# Altium footprint library con-molex.PCBLIB: 369 footprints (part 10 of 26) (continued)
## 52760-1079 [mm]
pads (104):
  round 0.9 hole 0.9: 1(-17.21,0)
  rect 0.35x2.5 smd: 1(-15.557,-2.35) 2(-15.557,2.35) 3(-14.922,-2.35) 4(-14.922,2.35) 5(-14.287,-2.35) 6(-14.287,2.35) 7(-13.652,-2.35) 8(-13.652,2.35) 9(-13.018,-2.35) 10(-13.018,2.35) 11(-12.383,-2.35) 12(-12.383,2.35) 13(-11.747,-2.35) 14(-11.747,2.35) 15(-11.112,-2.35) 16(-11.112,2.35) 17(-10.477,-2.35) 18(-10.477,2.35) 19(-9.842,-2.35) 20(-9.842,2.35) 21(-9.207,-2.35) 22(-9.207,2.35) 23(-8.572,-2.35) 24(-8.572,2.35) 25(-7.938,-2.35) 26(-7.938,2.35) 27(-7.302,-2.35) 28(-7.302,2.35) 29(-6.667,-2.35) 30(-6.667,2.35) 31(-6.032,-2.35) 32(-6.032,2.35) 33(-5.397,-2.35) 34(-5.397,2.35) 35(-4.763,-2.35) 36(-4.763,2.35) 37(-4.127,-2.35) 38(-4.127,2.35) 39(-3.492,-2.35) 40(-3.492,2.35) 41(-2.857,-2.35) 42(-2.857,2.35) 43(-2.222,-2.35) 44(-2.222,2.35) 45(-1.587,-2.35) 46(-1.587,2.35) 47(-0.953,-2.35) 48(-0.953,2.35) 49(-0.318,-2.35) 50(-0.318,2.35) 51(0.318,-2.35) 52(0.318,2.35) 53(0.953,-2.35) 54(0.953,2.35) 55(1.587,-2.35) 56(1.587,2.35) 57(2.222,-2.35) 58(2.222,2.35) 59(2.857,-2.35) 60(2.857,2.35) 61(3.492,-2.35) 62(3.492,2.35) 63(4.127,-2.35) 64(4.127,2.35) 65(4.763,-2.35) 66(4.763,2.35) 67(5.397,-2.35) 68(5.397,2.35) 69(6.032,-2.35) 70(6.032,2.35) 71(6.667,-2.35) 72(6.667,2.35) 73(7.302,-2.35) 74(7.302,2.35) 75(7.938,-2.35) 76(7.938,2.35) 77(8.572,-2.35) 78(8.572,2.35) 79(9.207,-2.35) 80(9.207,2.35) 81(9.842,-2.35) 82(9.842,2.35) 83(10.477,-2.35) 84(10.477,2.35) 85(11.112,-2.35) 86(11.112,2.35) 87(11.747,-2.35) 88(11.747,2.35) 89(12.383,-2.35) 90(12.383,2.35) 91(13.018,-2.35) 92(13.018,2.35) 93(13.652,-2.35) 94(13.652,2.35) 95(14.287,-2.35) 96(14.287,2.35) 97(14.922,-2.35) 98(14.922,2.35) 99(15.557,-2.35) 100(15.557,2.35)
  round 0.7 hole 0.7: 1(17.21,0)
  rect 2.5x2 smd: M1(-19.25,0) M2(19.25,0)
Top Overlay:
  lines w0.203: -19.125,-1.5 -19.725,-1.5 -19.725,-1.9 -18.525,-3.1 -17.725,-3.1 -17.725,-2.4 ; -19.125,1.5 -19.725,1.5 -19.725,3.1 -17.725,3.1 -17.725,2.4 ; -16.125,-2 -17.875,-2 -17.875,0 -17.125,0 -17.125,2 -16.125,2 ; -16.125,-1 cw(c-16.125,-0.75) -16.375,-0.75 -16.375,0.75 cw(c-16.125,0.75) -16.125,1 ; 16.125,-2 17.875,-2 17.875,0 17.125,0 17.125,2 16.125,2 ; 16.125,-1 ccw(c16.125,-0.75) 16.375,-0.75 16.375,0.75 ccw(c16.125,0.75) 16.125,1 ; 17.725,-2.4 17.725,-3.1 19.725,-3.1 19.725,-1.5 19.125,-1.5 ; 17.725,2.4 17.725,3.1 19.725,3.1 19.725,1.5 19.125,1.5
Top Solder:
  rectangle: -15.757,-3.625 -15.358,-1.075
  region: -15.358,3.625 -15.757,3.625 -15.757,1.075 -15.358,1.075
  rectangle: -15.122,-3.625 -14.723,-1.075
  region: -14.723,3.625 -15.122,3.625 -15.122,1.075 -14.723,1.075
  rectangle: -14.487,-3.625 -14.088,-1.075
  region: -14.088,3.625 -14.487,3.625 -14.487,1.075 -14.088,1.075
  rectangle: -13.852,-3.625 -13.453,-1.075
  region: -13.453,3.625 -13.852,3.625 -13.852,1.075 -13.453,1.075
  rectangle: -13.217,-3.625 -12.818,-1.075
  region: -12.818,3.625 -13.217,3.625 -13.217,1.075 -12.818,1.075
  rectangle: -12.582,-3.625 -12.183,-1.075
  region: -12.183,3.625 -12.582,3.625 -12.582,1.075 -12.183,1.075
  rectangle: -11.947,-3.625 -11.548,-1.075
  region: -11.548,3.625 -11.947,3.625 -11.947,1.075 -11.548,1.075
  rectangle: -11.312,-3.625 -10.913,-1.075
  region: -10.913,3.625 -11.312,3.625 -11.312,1.075 -10.913,1.075
  rectangle: -10.677,-3.625 -10.278,-1.075
  region: -10.278,3.625 -10.677,3.625 -10.677,1.075 -10.278,1.075
  rectangle: -10.042,-3.625 -9.643,-1.075
  region: -9.643,3.625 -10.042,3.625 -10.042,1.075 -9.643,1.075
  rectangle: -9.407,-3.625 -9.008,-1.075
  region: -9.008,3.625 -9.407,3.625 -9.407,1.075 -9.008,1.075
  rectangle: -8.772,-3.625 -8.373,-1.075
  region: -8.373,3.625 -8.772,3.625 -8.772,1.075 -8.373,1.075
  rectangle: -8.137,-3.625 -7.738,-1.075
  region: -7.738,3.625 -8.137,3.625 -8.137,1.075 -7.738,1.075
  rectangle: -7.502,-3.625 -7.103,-1.075
  region: -7.103,3.625 -7.502,3.625 -7.502,1.075 -7.103,1.075
  rectangle: -6.867,-3.625 -6.468,-1.075
  region: -6.468,3.625 -6.867,3.625 -6.867,1.075 -6.468,1.075
  rectangle: -6.232,-3.625 -5.833,-1.075
  region: -5.833,3.625 -6.232,3.625 -6.232,1.075 -5.833,1.075
  rectangle: -5.597,-3.625 -5.198,-1.075
  region: -5.198,3.625 -5.597,3.625 -5.597,1.075 -5.198,1.075
  rectangle: -4.962,-3.625 -4.563,-1.075
  region: -4.563,3.625 -4.962,3.625 -4.962,1.075 -4.563,1.075
  rectangle: -4.327,-3.625 -3.928,-1.075
  region: -3.928,3.625 -4.327,3.625 -4.327,1.075 -3.928,1.075
  rectangle: -3.692,-3.625 -3.293,-1.075
  region: -3.293,3.625 -3.692,3.625 -3.692,1.075 -3.293,1.075
  rectangle: -3.057,-3.625 -2.658,-1.075
  region: -2.658,3.625 -3.057,3.625 -3.057,1.075 -2.658,1.075
  rectangle: -2.422,-3.625 -2.023,-1.075
  region: -2.023,3.625 -2.422,3.625 -2.422,1.075 -2.023,1.075
  rectangle: -1.787,-3.625 -1.388,-1.075
  region: -1.388,3.625 -1.787,3.625 -1.787,1.075 -1.388,1.075
  rectangle: -1.152,-3.625 -0.753,-1.075
  region: -0.753,3.625 -1.152,3.625 -1.152,1.075 -0.753,1.075
  rectangle: -0.517,-3.625 -0.118,-1.075
  region: -0.118,3.625 -0.517,3.625 -0.517,1.075 -0.118,1.075
  rectangle: 0.118,-3.625 0.517,-1.075
  region: 0.517,3.625 0.118,3.625 0.118,1.075 0.517,1.075
  rectangle: 0.753,-3.625 1.152,-1.075
  region: 1.152,3.625 0.753,3.625 0.753,1.075 1.152,1.075
  rectangle: 1.388,-3.625 1.787,-1.075
  region: 1.787,3.625 1.388,3.625 1.388,1.075 1.787,1.075
  rectangle: 2.023,-3.625 2.422,-1.075
  region: 2.422,3.625 2.023,3.625 2.023,1.075 2.422,1.075
  rectangle: 2.658,-3.625 3.057,-1.075
  region: 3.057,3.625 2.658,3.625 2.658,1.075 3.057,1.075
  rectangle: 3.293,-3.625 3.692,-1.075
  region: 3.692,3.625 3.293,3.625 3.293,1.075 3.692,1.075
  rectangle: 3.928,-3.625 4.327,-1.075
  region: 4.327,3.625 3.928,3.625 3.928,1.075 4.327,1.075
  rectangle: 4.563,-3.625 4.962,-1.075
  region: 4.962,3.625 4.563,3.625 4.563,1.075 4.962,1.075
  rectangle: 5.198,-3.625 5.597,-1.075
  region: 5.597,3.625 5.198,3.625 5.198,1.075 5.597,1.075
  rectangle: 5.833,-3.625 6.232,-1.075
  region: 6.232,3.625 5.833,3.625 5.833,1.075 6.232,1.075
  rectangle: 6.468,-3.625 6.867,-1.075
  region: 6.867,3.625 6.468,3.625 6.468,1.075 6.867,1.075
  rectangle: 7.103,-3.625 7.502,-1.075
  region: 7.502,3.625 7.103,3.625 7.103,1.075 7.502,1.075
  rectangle: 7.738,-3.625 8.137,-1.075
  region: 8.137,3.625 7.738,3.625 7.738,1.075 8.137,1.075
  rectangle: 8.373,-3.625 8.772,-1.075
  region: 8.772,3.625 8.373,3.625 8.373,1.075 8.772,1.075
  rectangle: 9.008,-3.625 9.407,-1.075
  region: 9.407,3.625 9.008,3.625 9.008,1.075 9.407,1.075
  rectangle: 9.643,-3.625 10.042,-1.075
  region: 10.042,3.625 9.643,3.625 9.643,1.075 10.042,1.075
  rectangle: 10.278,-3.625 10.677,-1.075
  region: 10.677,3.625 10.278,3.625 10.278,1.075 10.677,1.075
  rectangle: 10.913,-3.625 11.312,-1.075
  region: 11.312,3.625 10.913,3.625 10.913,1.075 11.312,1.075
  rectangle: 11.548,-3.625 11.947,-1.075
  region: 11.947,3.625 11.548,3.625 11.548,1.075 11.947,1.075
  rectangle: 12.183,-3.625 12.582,-1.075
  region: 12.582,3.625 12.183,3.625 12.183,1.075 12.582,1.075
  rectangle: 12.818,-3.625 13.217,-1.075
  region: 13.217,3.625 12.818,3.625 12.818,1.075 13.217,1.075
  rectangle: 13.453,-3.625 13.852,-1.075
  region: 13.852,3.625 13.453,3.625 13.453,1.075 13.852,1.075
  rectangle: 14.088,-3.625 14.487,-1.075
  region: 14.487,3.625 14.088,3.625 14.088,1.075 14.487,1.075
  rectangle: 14.723,-3.625 15.122,-1.075
  region: 15.122,3.625 14.723,3.625 14.723,1.075 15.122,1.075
  rectangle: 15.358,-3.625 15.757,-1.075
  region: 15.757,3.625 15.358,3.625 15.358,1.075 15.757,1.075
Mechanical 16:
  rectangle: -15.708,-3.1 -15.407,-2.375
  region: -15.407,3.1 -15.708,3.1 -15.708,2.375 -15.407,2.375
  rectangle: -15.073,-3.1 -14.772,-2.375
  region: -14.772,3.1 -15.073,3.1 -15.073,2.375 -14.772,2.375
  rectangle: -14.438,-3.1 -14.137,-2.375
  region: -14.137,3.1 -14.438,3.1 -14.438,2.375 -14.137,2.375
  rectangle: -13.803,-3.1 -13.502,-2.375
  region: -13.502,3.1 -13.803,3.1 -13.803,2.375 -13.502,2.375
  rectangle: -13.168,-3.1 -12.867,-2.375
  region: -12.867,3.1 -13.168,3.1 -13.168,2.375 -12.867,2.375
  rectangle: -12.533,-3.1 -12.232,-2.375
  region: -12.232,3.1 -12.533,3.1 -12.533,2.375 -12.232,2.375
  rectangle: -11.898,-3.1 -11.597,-2.375
  region: -11.597,3.1 -11.898,3.1 -11.898,2.375 -11.597,2.375
  rectangle: -11.263,-3.1 -10.962,-2.375
  region: -10.962,3.1 -11.263,3.1 -11.263,2.375 -10.962,2.375
  rectangle: -10.628,-3.1 -10.327,-2.375
  region: -10.327,3.1 -10.628,3.1 -10.628,2.375 -10.327,2.375
  rectangle: -9.993,-3.1 -9.692,-2.375
  region: -9.692,3.1 -9.993,3.1 -9.993,2.375 -9.692,2.375
  rectangle: -9.358,-3.1 -9.057,-2.375
  region: -9.057,3.1 -9.358,3.1 -9.358,2.375 -9.057,2.375
  rectangle: -8.723,-3.1 -8.422,-2.375
  region: -8.422,3.1 -8.723,3.1 -8.723,2.375 -8.422,2.375
  rectangle: -8.088,-3.1 -7.787,-2.375
  region: -7.787,3.1 -8.088,3.1 -8.088,2.375 -7.787,2.375
  rectangle: -7.453,-3.1 -7.152,-2.375
  region: -7.152,3.1 -7.453,3.1 -7.453,2.375 -7.152,2.375
  rectangle: -6.818,-3.1 -6.517,-2.375
  region: -6.517,3.1 -6.818,3.1 -6.818,2.375 -6.517,2.375
  rectangle: -6.183,-3.1 -5.882,-2.375
  region: -5.882,3.1 -6.183,3.1 -6.183,2.375 -5.882,2.375
  rectangle: -5.548,-3.1 -5.247,-2.375
  region: -5.247,3.1 -5.548,3.1 -5.548,2.375 -5.247,2.375
  rectangle: -4.913,-3.1 -4.612,-2.375
  region: -4.612,3.1 -4.913,3.1 -4.913,2.375 -4.612,2.375
  rectangle: -4.278,-3.1 -3.977,-2.375
  region: -3.977,3.1 -4.278,3.1 -4.278,2.375 -3.977,2.375
  rectangle: -3.643,-3.1 -3.342,-2.375
  region: -3.342,3.1 -3.643,3.1 -3.643,2.375 -3.342,2.375
  rectangle: -3.008,-3.1 -2.707,-2.375
  region: -2.707,3.1 -3.008,3.1 -3.008,2.375 -2.707,2.375
  rectangle: -2.373,-3.1 -2.072,-2.375
  region: -2.072,3.1 -2.373,3.1 -2.373,2.375 -2.072,2.375
  rectangle: -1.738,-3.1 -1.437,-2.375
  region: -1.437,3.1 -1.738,3.1 -1.738,2.375 -1.437,2.375
  rectangle: -1.103,-3.1 -0.802,-2.375
  region: -0.802,3.1 -1.103,3.1 -1.103,2.375 -0.802,2.375
  rectangle: -0.468,-3.1 -0.167,-2.375
  region: -0.167,3.1 -0.468,3.1 -0.468,2.375 -0.167,2.375
  rectangle: 0.167,-3.1 0.468,-2.375
  region: 0.468,3.1 0.167,3.1 0.167,2.375 0.468,2.375
  rectangle: 0.802,-3.1 1.103,-2.375
  region: 1.103,3.1 0.802,3.1 0.802,2.375 1.103,2.375
  rectangle: 1.437,-3.1 1.738,-2.375
  region: 1.738,3.1 1.437,3.1 1.437,2.375 1.738,2.375
  rectangle: 2.072,-3.1 2.373,-2.375
  region: 2.373,3.1 2.072,3.1 2.072,2.375 2.373,2.375
  rectangle: 2.707,-3.1 3.008,-2.375
  region: 3.008,3.1 2.707,3.1 2.707,2.375 3.008,2.375
  rectangle: 3.342,-3.1 3.643,-2.375
  region: 3.643,3.1 3.342,3.1 3.342,2.375 3.643,2.375
  rectangle: 3.977,-3.1 4.278,-2.375
  region: 4.278,3.1 3.977,3.1 3.977,2.375 4.278,2.375
  rectangle: 4.612,-3.1 4.913,-2.375
  region: 4.913,3.1 4.612,3.1 4.612,2.375 4.913,2.375
  rectangle: 5.247,-3.1 5.548,-2.375
  region: 5.548,3.1 5.247,3.1 5.247,2.375 5.548,2.375
  rectangle: 5.882,-3.1 6.183,-2.375
  region: 6.183,3.1 5.882,3.1 5.882,2.375 6.183,2.375
  rectangle: 6.517,-3.1 6.818,-2.375
  region: 6.818,3.1 6.517,3.1 6.517,2.375 6.818,2.375
  rectangle: 7.152,-3.1 7.453,-2.375
  region: 7.453,3.1 7.152,3.1 7.152,2.375 7.453,2.375
  rectangle: 7.787,-3.1 8.088,-2.375
  region: 8.088,3.1 7.787,3.1 7.787,2.375 8.088,2.375
  rectangle: 8.422,-3.1 8.723,-2.375
  region: 8.723,3.1 8.422,3.1 8.422,2.375 8.723,2.375
  rectangle: 9.057,-3.1 9.358,-2.375
  region: 9.358,3.1 9.057,3.1 9.057,2.375 9.358,2.375
  rectangle: 9.692,-3.1 9.993,-2.375
  region: 9.993,3.1 9.692,3.1 9.692,2.375 9.993,2.375
  rectangle: 10.327,-3.1 10.628,-2.375
  region: 10.628,3.1 10.327,3.1 10.327,2.375 10.628,2.375
  rectangle: 10.962,-3.1 11.263,-2.375
  region: 11.263,3.1 10.962,3.1 10.962,2.375 11.263,2.375
  rectangle: 11.597,-3.1 11.898,-2.375
  region: 11.898,3.1 11.597,3.1 11.597,2.375 11.898,2.375
  rectangle: 12.232,-3.1 12.533,-2.375
  region: 12.533,3.1 12.232,3.1 12.232,2.375 12.533,2.375
  rectangle: 12.867,-3.1 13.168,-2.375
  region: 13.168,3.1 12.867,3.1 12.867,2.375 13.168,2.375
  rectangle: 13.502,-3.1 13.803,-2.375
  region: 13.803,3.1 13.502,3.1 13.502,2.375 13.803,2.375
  rectangle: 14.137,-3.1 14.438,-2.375
  region: 14.438,3.1 14.137,3.1 14.137,2.375 14.438,2.375
  rectangle: 14.772,-3.1 15.073,-2.375
  region: 15.073,3.1 14.772,3.1 14.772,2.375 15.073,2.375
  rectangle: 15.407,-3.1 15.708,-2.375
  region: 15.708,3.1 15.407,3.1 15.407,2.375 15.708,2.375
  lines w0.203: -19.125,-1.5 -19.125,1.5 ; -17.725,-2.4 17.725,-2.4 ; -17.725,2.4 17.725,2.4 ; -16.125,-2 16.125,-2 ; -16.125,-1 16.125,-1 ; -16.125,1 16.125,1 ; -16.125,2 16.125,2 ; 19.125,-1.5 19.125,1.5

## 52760-1279 [mm]
pads (124):
  round 0.9 hole 0.9: 1(-20.385,0)
  rect 0.35x2.5 smd: 1(-18.732,-2.35) 2(-18.732,2.35) 3(-18.098,-2.35) 4(-18.098,2.35) 5(-17.462,-2.35) 6(-17.462,2.35) 7(-16.828,-2.35) 8(-16.828,2.35) 9(-16.192,-2.35) 10(-16.192,2.35) 11(-15.557,-2.35) 12(-15.557,2.35) 13(-14.922,-2.35) 14(-14.922,2.35) 15(-14.287,-2.35) 16(-14.287,2.35) 17(-13.652,-2.35) 18(-13.652,2.35) 19(-13.018,-2.35) 20(-13.018,2.35) 21(-12.383,-2.35) 22(-12.383,2.35) 23(-11.747,-2.35) 24(-11.747,2.35) 25(-11.112,-2.35) 26(-11.112,2.35) 27(-10.477,-2.35) 28(-10.477,2.35) 29(-9.842,-2.35) 30(-9.842,2.35) 31(-9.207,-2.35) 32(-9.207,2.35) 33(-8.572,-2.35) 34(-8.572,2.35) 35(-7.938,-2.35) 36(-7.938,2.35) 37(-7.302,-2.35) 38(-7.302,2.35) 39(-6.667,-2.35) 40(-6.667,2.35) 41(-6.032,-2.35) 42(-6.032,2.35) 43(-5.397,-2.35) 44(-5.397,2.35) 45(-4.763,-2.35) 46(-4.763,2.35) 47(-4.127,-2.35) 48(-4.127,2.35) 49(-3.492,-2.35) 50(-3.492,2.35) 51(-2.857,-2.35) 52(-2.857,2.35) 53(-2.222,-2.35) 54(-2.222,2.35) 55(-1.587,-2.35) 56(-1.587,2.35) 57(-0.953,-2.35) 58(-0.953,2.35) 59(-0.318,-2.35) 60(-0.318,2.35) 61(0.318,-2.35) 62(0.318,2.35) 63(0.953,-2.35) 64(0.953,2.35) 65(1.587,-2.35) 66(1.587,2.35) 67(2.222,-2.35) 68(2.222,2.35) 69(2.857,-2.35) 70(2.857,2.35) 71(3.492,-2.35) 72(3.492,2.35) 73(4.127,-2.35) 74(4.127,2.35) 75(4.763,-2.35) 76(4.763,2.35) 77(5.397,-2.35) 78(5.397,2.35) 79(6.032,-2.35) 80(6.032,2.35) 81(6.667,-2.35) 82(6.667,2.35) 83(7.302,-2.35) 84(7.302,2.35) 85(7.938,-2.35) 86(7.938,2.35) 87(8.572,-2.35) 88(8.572,2.35) 89(9.207,-2.35) 90(9.207,2.35) 91(9.842,-2.35) 92(9.842,2.35) 93(10.477,-2.35) 94(10.477,2.35) 95(11.112,-2.35) 96(11.112,2.35) 97(11.747,-2.35) 98(11.747,2.35) 99(12.383,-2.35) 100(12.383,2.35) 101(13.018,-2.35) 102(13.018,2.35) 103(13.652,-2.35) 104(13.652,2.35) 105(14.287,-2.35) 106(14.287,2.35) 107(14.922,-2.35) 108(14.922,2.35) 109(15.557,-2.35) 110(15.557,2.35) 111(16.192,-2.35) 112(16.192,2.35) 113(16.828,-2.35) 114(16.828,2.35) 115(17.462,-2.35) 116(17.462,2.35) 117(18.098,-2.35) 118(18.098,2.35) 119(18.732,-2.35) 120(18.732,2.35)
  round 0.7 hole 0.7: 1(20.385,0)
  rect 2.5x2 smd: M1(-22.425,0) M2(22.425,0)
Top Overlay:
  lines w0.203: -22.3,-1.5 -22.9,-1.5 -22.9,-1.9 -21.7,-3.1 -20.9,-3.1 -20.9,-2.4 ; -22.3,1.5 -22.9,1.5 -22.9,3.1 -20.9,3.1 -20.9,2.4 ; -19.3,-2 -21.05,-2 -21.05,0 -20.3,0 -20.3,2 -19.3,2 ; -19.3,-1 cw(c-19.3,-0.75) -19.55,-0.75 -19.55,0.75 cw(c-19.3,0.75) -19.3,1 ; 19.3,-2 21.05,-2 21.05,0 20.3,0 20.3,2 19.3,2 ; 19.3,-1 ccw(c19.3,-0.75) 19.55,-0.75 19.55,0.75 ccw(c19.3,0.75) 19.3,1 ; 20.9,-2.4 20.9,-3.1 22.9,-3.1 22.9,-1.5 22.3,-1.5 ; 20.9,2.4 20.9,3.1 22.9,3.1 22.9,1.5 22.3,1.5
Top Solder:
  rectangle: -18.932,-3.625 -18.533,-1.075
  region: -18.533,3.625 -18.932,3.625 -18.932,1.075 -18.533,1.075
  rectangle: -18.297,-3.625 -17.898,-1.075
  region: -17.898,3.625 -18.297,3.625 -18.297,1.075 -17.898,1.075
  rectangle: -17.662,-3.625 -17.263,-1.075
  region: -17.263,3.625 -17.662,3.625 -17.662,1.075 -17.263,1.075
  rectangle: -17.027,-3.625 -16.628,-1.075
  region: -16.628,3.625 -17.027,3.625 -17.027,1.075 -16.628,1.075
  rectangle: -16.392,-3.625 -15.993,-1.075
  region: -15.993,3.625 -16.392,3.625 -16.392,1.075 -15.993,1.075
  rectangle: -15.757,-3.625 -15.358,-1.075
  region: -15.358,3.625 -15.757,3.625 -15.757,1.075 -15.358,1.075
  rectangle: -15.122,-3.625 -14.723,-1.075
  region: -14.723,3.625 -15.122,3.625 -15.122,1.075 -14.723,1.075
  rectangle: -14.487,-3.625 -14.088,-1.075
  region: -14.088,3.625 -14.487,3.625 -14.487,1.075 -14.088,1.075
  rectangle: -13.852,-3.625 -13.453,-1.075
  region: -13.453,3.625 -13.852,3.625 -13.852,1.075 -13.453,1.075
  rectangle: -13.217,-3.625 -12.818,-1.075
  region: -12.818,3.625 -13.217,3.625 -13.217,1.075 -12.818,1.075
  rectangle: -12.582,-3.625 -12.183,-1.075
  region: -12.183,3.625 -12.582,3.625 -12.582,1.075 -12.183,1.075
  rectangle: -11.947,-3.625 -11.548,-1.075
  region: -11.548,3.625 -11.947,3.625 -11.947,1.075 -11.548,1.075
  rectangle: -11.312,-3.625 -10.913,-1.075
  region: -10.913,3.625 -11.312,3.625 -11.312,1.075 -10.913,1.075
  rectangle: -10.677,-3.625 -10.278,-1.075
  region: -10.278,3.625 -10.677,3.625 -10.677,1.075 -10.278,1.075
  rectangle: -10.042,-3.625 -9.643,-1.075
  region: -9.643,3.625 -10.042,3.625 -10.042,1.075 -9.643,1.075
  rectangle: -9.407,-3.625 -9.008,-1.075
  region: -9.008,3.625 -9.407,3.625 -9.407,1.075 -9.008,1.075
  rectangle: -8.772,-3.625 -8.373,-1.075
  region: -8.373,3.625 -8.772,3.625 -8.772,1.075 -8.373,1.075
  rectangle: -8.137,-3.625 -7.738,-1.075
  region: -7.738,3.625 -8.137,3.625 -8.137,1.075 -7.738,1.075
  rectangle: -7.502,-3.625 -7.103,-1.075
  region: -7.103,3.625 -7.502,3.625 -7.502,1.075 -7.103,1.075
  rectangle: -6.867,-3.625 -6.468,-1.075
  region: -6.468,3.625 -6.867,3.625 -6.867,1.075 -6.468,1.075
  rectangle: -6.232,-3.625 -5.833,-1.075
  region: -5.833,3.625 -6.232,3.625 -6.232,1.075 -5.833,1.075
  rectangle: -5.597,-3.625 -5.198,-1.075
  region: -5.198,3.625 -5.597,3.625 -5.597,1.075 -5.198,1.075
  rectangle: -4.962,-3.625 -4.563,-1.075
  region: -4.563,3.625 -4.962,3.625 -4.962,1.075 -4.563,1.075
  rectangle: -4.327,-3.625 -3.928,-1.075
  region: -3.928,3.625 -4.327,3.625 -4.327,1.075 -3.928,1.075
  rectangle: -3.692,-3.625 -3.293,-1.075
  region: -3.293,3.625 -3.692,3.625 -3.692,1.075 -3.293,1.075
  rectangle: -3.057,-3.625 -2.658,-1.075
  region: -2.658,3.625 -3.057,3.625 -3.057,1.075 -2.658,1.075
  rectangle: -2.422,-3.625 -2.023,-1.075
  region: -2.023,3.625 -2.422,3.625 -2.422,1.075 -2.023,1.075
  rectangle: -1.787,-3.625 -1.388,-1.075
  region: -1.388,3.625 -1.787,3.625 -1.787,1.075 -1.388,1.075
  rectangle: -1.152,-3.625 -0.753,-1.075
  region: -0.753,3.625 -1.152,3.625 -1.152,1.075 -0.753,1.075
  rectangle: -0.517,-3.625 -0.118,-1.075
  region: -0.118,3.625 -0.517,3.625 -0.517,1.075 -0.118,1.075
  rectangle: 0.118,-3.625 0.517,-1.075
  region: 0.517,3.625 0.118,3.625 0.118,1.075 0.517,1.075
  rectangle: 0.753,-3.625 1.152,-1.075
  region: 1.152,3.625 0.753,3.625 0.753,1.075 1.152,1.075
  rectangle: 1.388,-3.625 1.787,-1.075
  region: 1.787,3.625 1.388,3.625 1.388,1.075 1.787,1.075
  rectangle: 2.023,-3.625 2.422,-1.075
  region: 2.422,3.625 2.023,3.625 2.023,1.075 2.422,1.075
  rectangle: 2.658,-3.625 3.057,-1.075
  region: 3.057,3.625 2.658,3.625 2.658,1.075 3.057,1.075
  rectangle: 3.293,-3.625 3.692,-1.075
  region: 3.692,3.625 3.293,3.625 3.293,1.075 3.692,1.075
  rectangle: 3.928,-3.625 4.327,-1.075
  region: 4.327,3.625 3.928,3.625 3.928,1.075 4.327,1.075
  rectangle: 4.563,-3.625 4.962,-1.075
  region: 4.962,3.625 4.563,3.625 4.563,1.075 4.962,1.075
  rectangle: 5.198,-3.625 5.597,-1.075
  region: 5.597,3.625 5.198,3.625 5.198,1.075 5.597,1.075
  rectangle: 5.833,-3.625 6.232,-1.075
  region: 6.232,3.625 5.833,3.625 5.833,1.075 6.232,1.075
  rectangle: 6.468,-3.625 6.867,-1.075
  region: 6.867,3.625 6.468,3.625 6.468,1.075 6.867,1.075
  rectangle: 7.103,-3.625 7.502,-1.075
  region: 7.502,3.625 7.103,3.625 7.103,1.075 7.502,1.075
  rectangle: 7.738,-3.625 8.137,-1.075
  region: 8.137,3.625 7.738,3.625 7.738,1.075 8.137,1.075
  rectangle: 8.373,-3.625 8.772,-1.075
  region: 8.772,3.625 8.373,3.625 8.373,1.075 8.772,1.075
  rectangle: 9.008,-3.625 9.407,-1.075
  region: 9.407,3.625 9.008,3.625 9.008,1.075 9.407,1.075
  rectangle: 9.643,-3.625 10.042,-1.075
  region: 10.042,3.625 9.643,3.625 9.643,1.075 10.042,1.075
  rectangle: 10.278,-3.625 10.677,-1.075
  region: 10.677,3.625 10.278,3.625 10.278,1.075 10.677,1.075
  rectangle: 10.913,-3.625 11.312,-1.075
  region: 11.312,3.625 10.913,3.625 10.913,1.075 11.312,1.075
  rectangle: 11.548,-3.625 11.947,-1.075
  region: 11.947,3.625 11.548,3.625 11.548,1.075 11.947,1.075
  rectangle: 12.183,-3.625 12.582,-1.075
  region: 12.582,3.625 12.183,3.625 12.183,1.075 12.582,1.075
  rectangle: 12.818,-3.625 13.217,-1.075
  region: 13.217,3.625 12.818,3.625 12.818,1.075 13.217,1.075
  rectangle: 13.453,-3.625 13.852,-1.075
  region: 13.852,3.625 13.453,3.625 13.453,1.075 13.852,1.075
  rectangle: 14.088,-3.625 14.487,-1.075
  region: 14.487,3.625 14.088,3.625 14.088,1.075 14.487,1.075
  rectangle: 14.723,-3.625 15.122,-1.075
  region: 15.122,3.625 14.723,3.625 14.723,1.075 15.122,1.075
  rectangle: 15.358,-3.625 15.757,-1.075
  region: 15.757,3.625 15.358,3.625 15.358,1.075 15.757,1.075
  rectangle: 15.993,-3.625 16.392,-1.075
  region: 16.392,3.625 15.993,3.625 15.993,1.075 16.392,1.075
  rectangle: 16.628,-3.625 17.027,-1.075
  region: 17.027,3.625 16.628,3.625 16.628,1.075 17.027,1.075
  rectangle: 17.263,-3.625 17.662,-1.075
  region: 17.662,3.625 17.263,3.625 17.263,1.075 17.662,1.075
  rectangle: 17.898,-3.625 18.297,-1.075
  region: 18.297,3.625 17.898,3.625 17.898,1.075 18.297,1.075
  rectangle: 18.533,-3.625 18.932,-1.075
  region: 18.932,3.625 18.533,3.625 18.533,1.075 18.932,1.075
Mechanical 16:
  rectangle: -18.883,-3.1 -18.582,-2.375
  region: -18.582,3.1 -18.883,3.1 -18.883,2.375 -18.582,2.375
  rectangle: -18.248,-3.1 -17.947,-2.375
  region: -17.947,3.1 -18.248,3.1 -18.248,2.375 -17.947,2.375
  rectangle: -17.613,-3.1 -17.312,-2.375
  region: -17.312,3.1 -17.613,3.1 -17.613,2.375 -17.312,2.375
  rectangle: -16.978,-3.1 -16.677,-2.375
  region: -16.677,3.1 -16.978,3.1 -16.978,2.375 -16.677,2.375
  rectangle: -16.343,-3.1 -16.042,-2.375
  region: -16.042,3.1 -16.343,3.1 -16.343,2.375 -16.042,2.375
  rectangle: -15.708,-3.1 -15.407,-2.375
  region: -15.407,3.1 -15.708,3.1 -15.708,2.375 -15.407,2.375
  rectangle: -15.073,-3.1 -14.772,-2.375
  region: -14.772,3.1 -15.073,3.1 -15.073,2.375 -14.772,2.375
  rectangle: -14.438,-3.1 -14.137,-2.375
  region: -14.137,3.1 -14.438,3.1 -14.438,2.375 -14.137,2.375
  rectangle: -13.803,-3.1 -13.502,-2.375
  region: -13.502,3.1 -13.803,3.1 -13.803,2.375 -13.502,2.375
  rectangle: -13.168,-3.1 -12.867,-2.375
  region: -12.867,3.1 -13.168,3.1 -13.168,2.375 -12.867,2.375
  rectangle: -12.533,-3.1 -12.232,-2.375
  region: -12.232,3.1 -12.533,3.1 -12.533,2.375 -12.232,2.375
  rectangle: -11.898,-3.1 -11.597,-2.375
  region: -11.597,3.1 -11.898,3.1 -11.898,2.375 -11.597,2.375
  rectangle: -11.263,-3.1 -10.962,-2.375
  region: -10.962,3.1 -11.263,3.1 -11.263,2.375 -10.962,2.375
  rectangle: -10.628,-3.1 -10.327,-2.375
  region: -10.327,3.1 -10.628,3.1 -10.628,2.375 -10.327,2.375
  rectangle: -9.993,-3.1 -9.692,-2.375
  region: -9.692,3.1 -9.993,3.1 -9.993,2.375 -9.692,2.375
  rectangle: -9.358,-3.1 -9.057,-2.375
  region: -9.057,3.1 -9.358,3.1 -9.358,2.375 -9.057,2.375
  rectangle: -8.723,-3.1 -8.422,-2.375
  region: -8.422,3.1 -8.723,3.1 -8.723,2.375 -8.422,2.375
  rectangle: -8.088,-3.1 -7.787,-2.375
  region: -7.787,3.1 -8.088,3.1 -8.088,2.375 -7.787,2.375
  rectangle: -7.453,-3.1 -7.152,-2.375
  region: -7.152,3.1 -7.453,3.1 -7.453,2.375 -7.152,2.375
  rectangle: -6.818,-3.1 -6.517,-2.375
  region: -6.517,3.1 -6.818,3.1 -6.818,2.375 -6.517,2.375
  rectangle: -6.183,-3.1 -5.882,-2.375
  region: -5.882,3.1 -6.183,3.1 -6.183,2.375 -5.882,2.375
  rectangle: -5.548,-3.1 -5.247,-2.375
  region: -5.247,3.1 -5.548,3.1 -5.548,2.375 -5.247,2.375
  rectangle: -4.913,-3.1 -4.612,-2.375
  region: -4.612,3.1 -4.913,3.1 -4.913,2.375 -4.612,2.375
  rectangle: -4.278,-3.1 -3.977,-2.375
  region: -3.977,3.1 -4.278,3.1 -4.278,2.375 -3.977,2.375
  rectangle: -3.643,-3.1 -3.342,-2.375
  region: -3.342,3.1 -3.643,3.1 -3.643,2.375 -3.342,2.375
  rectangle: -3.008,-3.1 -2.707,-2.375
  region: -2.707,3.1 -3.008,3.1 -3.008,2.375 -2.707,2.375
  rectangle: -2.373,-3.1 -2.072,-2.375
  region: -2.072,3.1 -2.373,3.1 -2.373,2.375 -2.072,2.375
  rectangle: -1.738,-3.1 -1.437,-2.375
  region: -1.437,3.1 -1.738,3.1 -1.738,2.375 -1.437,2.375
  rectangle: -1.103,-3.1 -0.802,-2.375
  region: -0.802,3.1 -1.103,3.1 -1.103,2.375 -0.802,2.375
  rectangle: -0.468,-3.1 -0.167,-2.375
  region: -0.167,3.1 -0.468,3.1 -0.468,2.375 -0.167,2.375
  rectangle: 0.167,-3.1 0.468,-2.375
  region: 0.468,3.1 0.167,3.1 0.167,2.375 0.468,2.375
  rectangle: 0.802,-3.1 1.103,-2.375
  region: 1.103,3.1 0.802,3.1 0.802,2.375 1.103,2.375
  rectangle: 1.437,-3.1 1.738,-2.375
  region: 1.738,3.1 1.437,3.1 1.437,2.375 1.738,2.375
  rectangle: 2.072,-3.1 2.373,-2.375
  region: 2.373,3.1 2.072,3.1 2.072,2.375 2.373,2.375
  rectangle: 2.707,-3.1 3.008,-2.375
  region: 3.008,3.1 2.707,3.1 2.707,2.375 3.008,2.375
  rectangle: 3.342,-3.1 3.643,-2.375
  region: 3.643,3.1 3.342,3.1 3.342,2.375 3.643,2.375
  rectangle: 3.977,-3.1 4.278,-2.375
  region: 4.278,3.1 3.977,3.1 3.977,2.375 4.278,2.375
  rectangle: 4.612,-3.1 4.913,-2.375
  region: 4.913,3.1 4.612,3.1 4.612,2.375 4.913,2.375
  rectangle: 5.247,-3.1 5.548,-2.375
  region: 5.548,3.1 5.247,3.1 5.247,2.375 5.548,2.375
  rectangle: 5.882,-3.1 6.183,-2.375
  region: 6.183,3.1 5.882,3.1 5.882,2.375 6.183,2.375
  rectangle: 6.517,-3.1 6.818,-2.375
  region: 6.818,3.1 6.517,3.1 6.517,2.375 6.818,2.375
  rectangle: 7.152,-3.1 7.453,-2.375
  region: 7.453,3.1 7.152,3.1 7.152,2.375 7.453,2.375
  rectangle: 7.787,-3.1 8.088,-2.375
  region: 8.088,3.1 7.787,3.1 7.787,2.375 8.088,2.375
  rectangle: 8.422,-3.1 8.723,-2.375
  region: 8.723,3.1 8.422,3.1 8.422,2.375 8.723,2.375
  rectangle: 9.057,-3.1 9.358,-2.375
  region: 9.358,3.1 9.057,3.1 9.057,2.375 9.358,2.375
  rectangle: 9.692,-3.1 9.993,-2.375
  region: 9.993,3.1 9.692,3.1 9.692,2.375 9.993,2.375
  rectangle: 10.327,-3.1 10.628,-2.375
  region: 10.628,3.1 10.327,3.1 10.327,2.375 10.628,2.375
  rectangle: 10.962,-3.1 11.263,-2.375
  region: 11.263,3.1 10.962,3.1 10.962,2.375 11.263,2.375
  rectangle: 11.597,-3.1 11.898,-2.375
  region: 11.898,3.1 11.597,3.1 11.597,2.375 11.898,2.375
  rectangle: 12.232,-3.1 12.533,-2.375
  region: 12.533,3.1 12.232,3.1 12.232,2.375 12.533,2.375
  rectangle: 12.867,-3.1 13.168,-2.375
  region: 13.168,3.1 12.867,3.1 12.867,2.375 13.168,2.375
  rectangle: 13.502,-3.1 13.803,-2.375
  region: 13.803,3.1 13.502,3.1 13.502,2.375 13.803,2.375
  rectangle: 14.137,-3.1 14.438,-2.375
  region: 14.438,3.1 14.137,3.1 14.137,2.375 14.438,2.375
  rectangle: 14.772,-3.1 15.073,-2.375
  region: 15.073,3.1 14.772,3.1 14.772,2.375 15.073,2.375
  rectangle: 15.407,-3.1 15.708,-2.375
  region: 15.708,3.1 15.407,3.1 15.407,2.375 15.708,2.375
  rectangle: 16.042,-3.1 16.343,-2.375
  region: 16.343,3.1 16.042,3.1 16.042,2.375 16.343,2.375
  rectangle: 16.677,-3.1 16.978,-2.375
  region: 16.978,3.1 16.677,3.1 16.677,2.375 16.978,2.375
  rectangle: 17.312,-3.1 17.613,-2.375
  region: 17.613,3.1 17.312,3.1 17.312,2.375 17.613,2.375
  rectangle: 17.947,-3.1 18.248,-2.375
  region: 18.248,3.1 17.947,3.1 17.947,2.375 18.248,2.375
  rectangle: 18.582,-3.1 18.883,-2.375
  region: 18.883,3.1 18.582,3.1 18.582,2.375 18.883,2.375
  lines w0.203: -22.3,-1.5 -22.3,1.5 ; -20.9,-2.4 20.9,-2.4 ; -20.9,2.4 20.9,2.4 ; -19.3,-2 19.3,-2 ; -19.3,-1 19.3,-1 ; -19.3,1 19.3,1 ; -19.3,2 19.3,2 ; 22.3,-1.5 22.3,1.5